# Altium footprint library MyPcbLib.PcbLib: 657 footprints (part 10 of 42)
Each footprint in its own frame and in the unit in brackets; x right, y up, seen from the top. Pads: shape width x height; smd on the part's side, far side on the other; paste and mask are expansions set on the pad; w line width, h text height; cw(c..) or ccw(c..) is an arc to the next point about the centre after c.
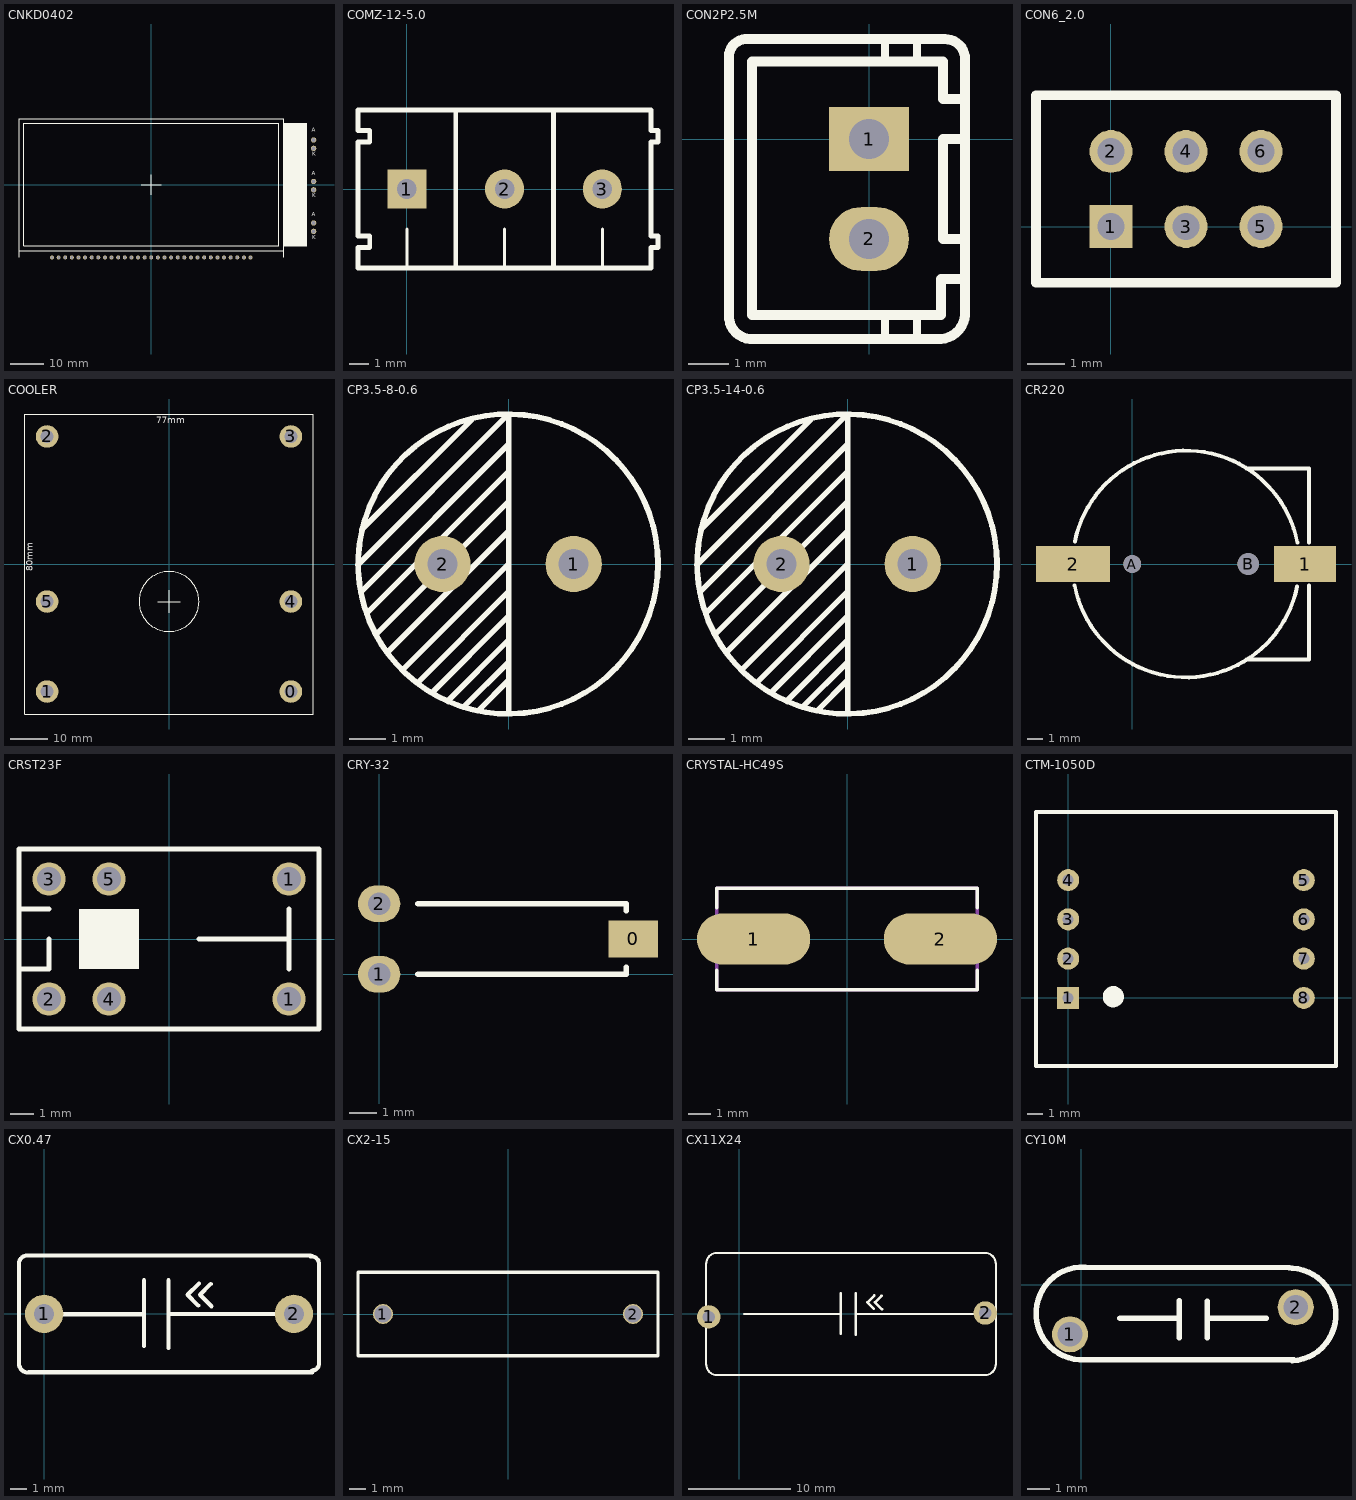
[diagram p9: the footprints below, top view; thin cyan lines are the x and y axes]

## CNKD0402 [mm]
pads (37):
  round 1.2 hole 0.8: 1(-30.023,-21.971) 2(-28.023,-21.971) 3(-26.023,-21.971) 4(-24.023,-21.971) 5(-22.023,-21.971) 6(-20.023,-21.971) 7(-18.023,-21.971) 8(-16.023,-21.971) 9(-14.023,-21.971) 10(-12.023,-21.971) 11(-10.023,-21.971) 12(-8.023,-21.971) 13(-6.023,-21.971) 14(-4.023,-21.971) 15(-2.023,-21.971) 16(-0.023,-21.971) 17(1.977,-21.971) 18(3.977,-21.971) 19(5.977,-21.971) 20(7.977,-21.971) 21(9.977,-21.971) 22(11.977,-21.971) 23(13.977,-21.971) 24(15.977,-21.971) 25(17.977,-21.971) 26(19.977,-21.971) 27(21.977,-21.971) 28(23.977,-21.971) 29(25.977,-21.971) 30(27.977,-21.971) 31(29.977,-21.971)
  round 1.6 hole 1.2: 35(49.056,13.554) 36(49.056,11.014) 37(49.056,1.014) 38(49.056,-1.526) 39(49.056,-11.526) 40(49.056,-14.066)
Top Overlay:
  rectangle: 40.056,-18.415 46.965,18.491
  lines w0.127: -39.995,-21.971 -39.995,20.029 ; -39.98,20.015 40.005,20.015 ; -39.929,-19.971 40.005,-19.971 ; -38.506,-18.471 38.506,-18.471 ; -38.495,-18.471 -38.495,18.529 ; -38.481,18.529 38.506,18.529 ; -2.995,0.025 3.005,0.025 ; 0.005,-2.975 0.005,3.025 ; 38.505,-18.471 38.505,18.529 ; 40.005,-21.971 40.005,20.029 ; 40.005,-18.471 47.005,-18.471 ; 40.005,18.529 47.005,18.529 ; 46.99,-18.466 46.99,18.491
  text "K" at 48.676,8.382 h2
  text "K" at 48.676,-4.216 h2
  text "K" at 48.676,-16.942 h2
  text "A" at 48.539,-10.033 h2
  text "A" at 48.539,2.438 h2
  text "A" at 48.539,15.621 h2

## COMZ-12-5.0 [mil]
pads (3):
  rect 80x80 hole 40: 1(0,0)
  round 80 hole 40: 2(200,0) 3(400,0)
Top Overlay:
  lines w6.06: 0,-162 0,-82 ; 200,-162 200,-82 ; 400,-162 400,-82
  lines w10: 100,-162 100,162 ; 300,-162 300,162 ; -100,-162 500,-162 500,-120 514,-120 514,-96 500,-96 500,96 514,96 514,120 500,120 500,162 -100,162 -100,120 -76,120 -76,96 -100,96 -100,-96 -76,-96 -76,-120 -100,-120 -100,-162

## CON2P2.5M [mm]
pads (2):
  rect 2x1.6 hole 1: 1(0,0)
  oval 2x1.6 hole 1: 2(0,-2.5)
Top Overlay:
  lines w0.2: 0.4,-4.96 0.4,-4.4 ; 0.4,1.94 0.4,2.5 ; 1.2,-4.96 1.2,-4.4 ; 1.2,1.94 1.2,2.5
  lines w0.25: -3.5,-4.4 -3.5,2 cw(c-3.061,2.059) -3.1,2.5 ; -3.5,-4.4 ccw(c-2.937,-4.437) -2.98,-5 ; -3.1,2.5 1.9,2.5 ; -2.98,-5 1.8,-5 ccw(c1.756,-4.355) 2.4,-4.3 2.4,2 ccw(c1.908,2.008) 1.9,2.5 ; -2.93,-4.4 1.8,-4.4 1.8,-3.5 2.4,-3.5 2.4,-2.5 1.85,-2.5 1.85,0 2.4,0 2.4,1 1.85,1 1.85,1.94 -2.93,1.94 -2.93,-4.4

## CON6_2.0 [mil]
pads (6):
  rect 45x45 hole 28: 1(0,0)
  round 45 hole 28: 2(0,78.74) 3(78.74,0) 4(78.74,78.74) 5(157.48,0) 6(157.48,78.74)
Top Overlay:
  lines w10: -78.74,-59.05 236.22,-59.05 236.22,137.8 -78.74,137.8 -78.74,-59.05

## COOLER [mm]
pads (6):
  round 6 hole 3.5: 0(32.5,-34) 1(-32.5,-34) 2(-32.5,34) 3(32.5,34) 4(32.5,-10) 5(-32.5,-10)
Top Overlay:
  circle w0.254: c0,-10 r8
  lines w0.203: -3,-10 3,-10 ; 0,-13 0,-7 ; -38.5,-40 38.5,-40 38.5,40 -38.5,40 -38.5,-40
  text "80mm" at -35.687,-1.981 h3
  text "77mm" at -3.404,36.906 h3

## CP3.5-8-0.6 [mil]
pads (2):
  round 60 hole 32: 1(69.42,0.04) 2(-70.58,0.04)
Top Overlay:
  circle w6: c-0.58,0.04 r160
  lines w6: -160.8,-0.8 0,160 0,-159.8 ; -158,-30.2 0,127.8 0,127 ; -156.8,36.8 -39.2,154.4 ; -151.6,-53 0,98.6 ; -141.2,-74.6 0,66.6 0,66.4 ; -129.2,-94.2 0,35 ; -113.2,-113.2 0,0 ; -97.4,-126.8 0,-29.4 ; -82,-137.4 0,-55.4 0,-55 ; -65,-146 0,-81 ; -48,-152.8 0,-104.8 0,-104.6 ; -32.8,-156.8 0,-124 0,-123.6 ; 0,147.8 0,148.2
3D body: height 283.09, standoff -100.39, extent -157.48,-153.96 157.48,161

## CP3.5-14-0.6 [mil]
pads (2):
  round 60 hole 32: 1(69.42,0.04) 2(-70.58,0.04)
Top Overlay:
  circle w6: c-0.58,0.04 r160
  lines w6: -160.8,-0.8 0,160 0,-159.8 ; -158,-30.2 0,127.8 0,127 ; -156.8,36.8 -39.2,154.4 ; -151.6,-53 0,98.6 ; -141.2,-74.6 0,66.6 0,66.4 ; -129.2,-94.2 0,35 ; -113.2,-113.2 0,0 ; -97.4,-126.8 0,-29.4 ; -82,-137.4 0,-55.4 0,-55 ; -65,-146 0,-81 ; -48,-152.8 0,-104.8 0,-104.6 ; -32.8,-156.8 0,-124 0,-123.6 ; 0,147.8 0,148.2
3D body: height 590.55, standoff -187.01, extent -158.48,-157.48 156.49,157.49

## CR220 [mm]
pads (4):
  rect 4.02x2.37 smd: 1(11.25,0.012)
  rect 4.82x2.32 smd: 2(-3.85,0.012)
  round 1.15 hole 1.15 unplated: A(0,0.012)
  round 1.4 hole 1.4 unplated: B(7.55,0.012)
Top Overlay:
  lines w0.254: -3.742,-1.386 ccw(c3.5,0.012) 10.728,-1.458 ; -3.728,1.482 cw(c3.5,0.012) 10.742,1.41 ; 7.437,-6.211 11.501,-6.211 11.501,-1.385 ; 7.437,6.235 11.501,6.235 11.501,1.409

## CRST23F [mm] "https://item.taobao.com/item.htm?spm=a230r.1.14.22.4e516dd16ZId7k&id=529810744652&ns=1&abbucket=8#detail"
pads (6):
  round 1.4 hole 1: 1(5.08,-2.54) 1(5.08,2.54) 2(-5.08,-2.54) 3(-5.08,2.54) 4(-2.54,-2.54) 5(-2.54,2.54)
Top Overlay:
  rectangle: -3.81,-1.27 -1.27,1.27
  lines w0.203: -6.35,-1.27 -5.08,-1.27 -5.08,0 ; -6.35,1.27 -5.08,1.27 ; 1.27,0 5.08,0 ; 5.08,-1.27 5.08,1.27 ; -6.35,-3.81 6.35,-3.81 6.35,3.81 -6.35,3.81 -6.35,-3.81

## CRY-32 [mil]
pads (3):
  rect 70x52 smd: 0(360,50)
  oval 60x52 hole 32: 1(0,0) 2(0,100)
Top Overlay:
  lines w8: 55,0 350,0 350,10 ; 55,100 350,100 350,90

## CRYSTAL-HC49S [mil]
pads (2):
  oval 200x90 smd: 1(-165.05,0.1) 2(164.95,0.1)
Top Overlay:
  lines w6: -230.05,-54.9 -230.05,-89.9 229.95,-89.9 229.95,-54.9 ; -230.05,55.1 -230.05,90.1 229.95,90.1 229.95,55.1
Mechanical 1:
  lines w6: -230.05,-89.9 -230.05,90.1 229.95,90.1 229.95,-89.9 -230.05,-89.9

## CTM-1050D [mil]
height 9.5
pads (8):
  rect 56x56 hole 28: 1(0,0)
  round 56 hole 28: 2(0,100) 3(0,200) 4(0,300) 5(600,300) 6(600,200) 7(600,100) 8(600,0)
Top Overlay:
  circle w30: c115,3 r12
  lines w10: -82,-173 -82,473 682,473 682,-173 -82,-173

## CX0.47 [mm]
pads (2):
  round 2.3 hole 1.2: 1(0,0) 2(15,0)
Top Overlay:
  lines w0.25: -1.5,-3.024 ccw(c-0.972,-3) -0.9,-3.524 ; -1.5,-3 -1.5,3 ; -1.5,2.914 cw(c-0.993,3) -1,3.514 ; -1,3.5 16,3.5 ; -0.9,-3.5 16.1,-3.5 ; 1.03,-0.02 5.97,-0.02 ; 6,-1.92 6,2.02 ; 7.46,-2.04 7.46,2.02 ; 7.6,0 13.84,0 ; 9.25,0.51 8.61,1.15 9.29,1.83 ; 10,1.79 9.36,1.15 10.05,0.46 ; 16,3.458 cw(c16.044,3) 16.5,3.058 ; 16.1,-3.391 ccw(c16.109,-3) 16.5,-2.991 ; 16.5,-3 16.5,3

## CX2-15 [mm]
pads (2):
  round 1.2 hole 1: 1(-7.5,0) 2(7.5,0)
Top Overlay:
  lines w0.203: -9,-2.5 -9,2.5 9,2.5 9,-2.5 -9,-2.5

## CX11X24 [mm]
pads (2):
  round 2.3 hole 1.2: 1(-2.985,-0.285) 2(24.2,0.1)
Top Overlay:
  lines w0.2: -3.25,-5 -3.25,5 ; -3.2,-5 ccw(c-2.2,-5) -2.2,-6 24.1,-6 ; -3.2,5 cw(c-2.2,5) -2.2,6 24.1,6 ; 0.5,0 10,0 ; 11.46,0 22.5,0 23.25,0 ; 24.2,-6 ccw(c24.2,-5) 25.2,-5 ; 24.2,6 cw(c24.2,5) 25.2,5 ; 25.25,-5 25.25,5
  lines w0.25: 10,-1.92 10,2.02 ; 11.46,-2.04 11.46,2.02 ; 13.25,0.51 12.61,1.15 13.29,1.83 ; 14,1.79 13.36,1.15 14.05,0.46

## CY10M [mm]
pads (2):
  round 1.6 / inner round 1.6 / far side round 2.5 hole 1.1: 1(-0.5,-2.2) 2(9.5,-1)
Top Overlay:
  lines w0.25: 1.717,-1.489 4.297,-1.489 ; 4.347,-2.359 4.347,-0.719 ; 5.587,-2.349 5.587,-0.729 ; 5.607,-1.489 8.187,-1.489 ; 9.216,0.751 0.188,0.774 ccw(c0.05,-1.276) 0.188,-3.326 9.419,-3.338 ; 9.343,-3.374 ccw(c9.232,-1.324) 9.343,0.726
Bottom Solder:
  lines w0.051: -0.256,-0.016 0.252,-0.016 -0.256,-0.016 ; -0.002,-0.27 -0.002,0.238 -0.002,-0.27